# Altium footprint library SI944C.PcbLib: 78 footprints (part 2 of 5)
Each footprint in its own frame and in the unit in brackets; x right, y up, seen from the top. Pads: shape width x height; smd on the part's side, far side on the other; paste and mask are expansions set on the pad; w line width, h text height; cw(c..) or ccw(c..) is an arc to the next point about the centre after c.
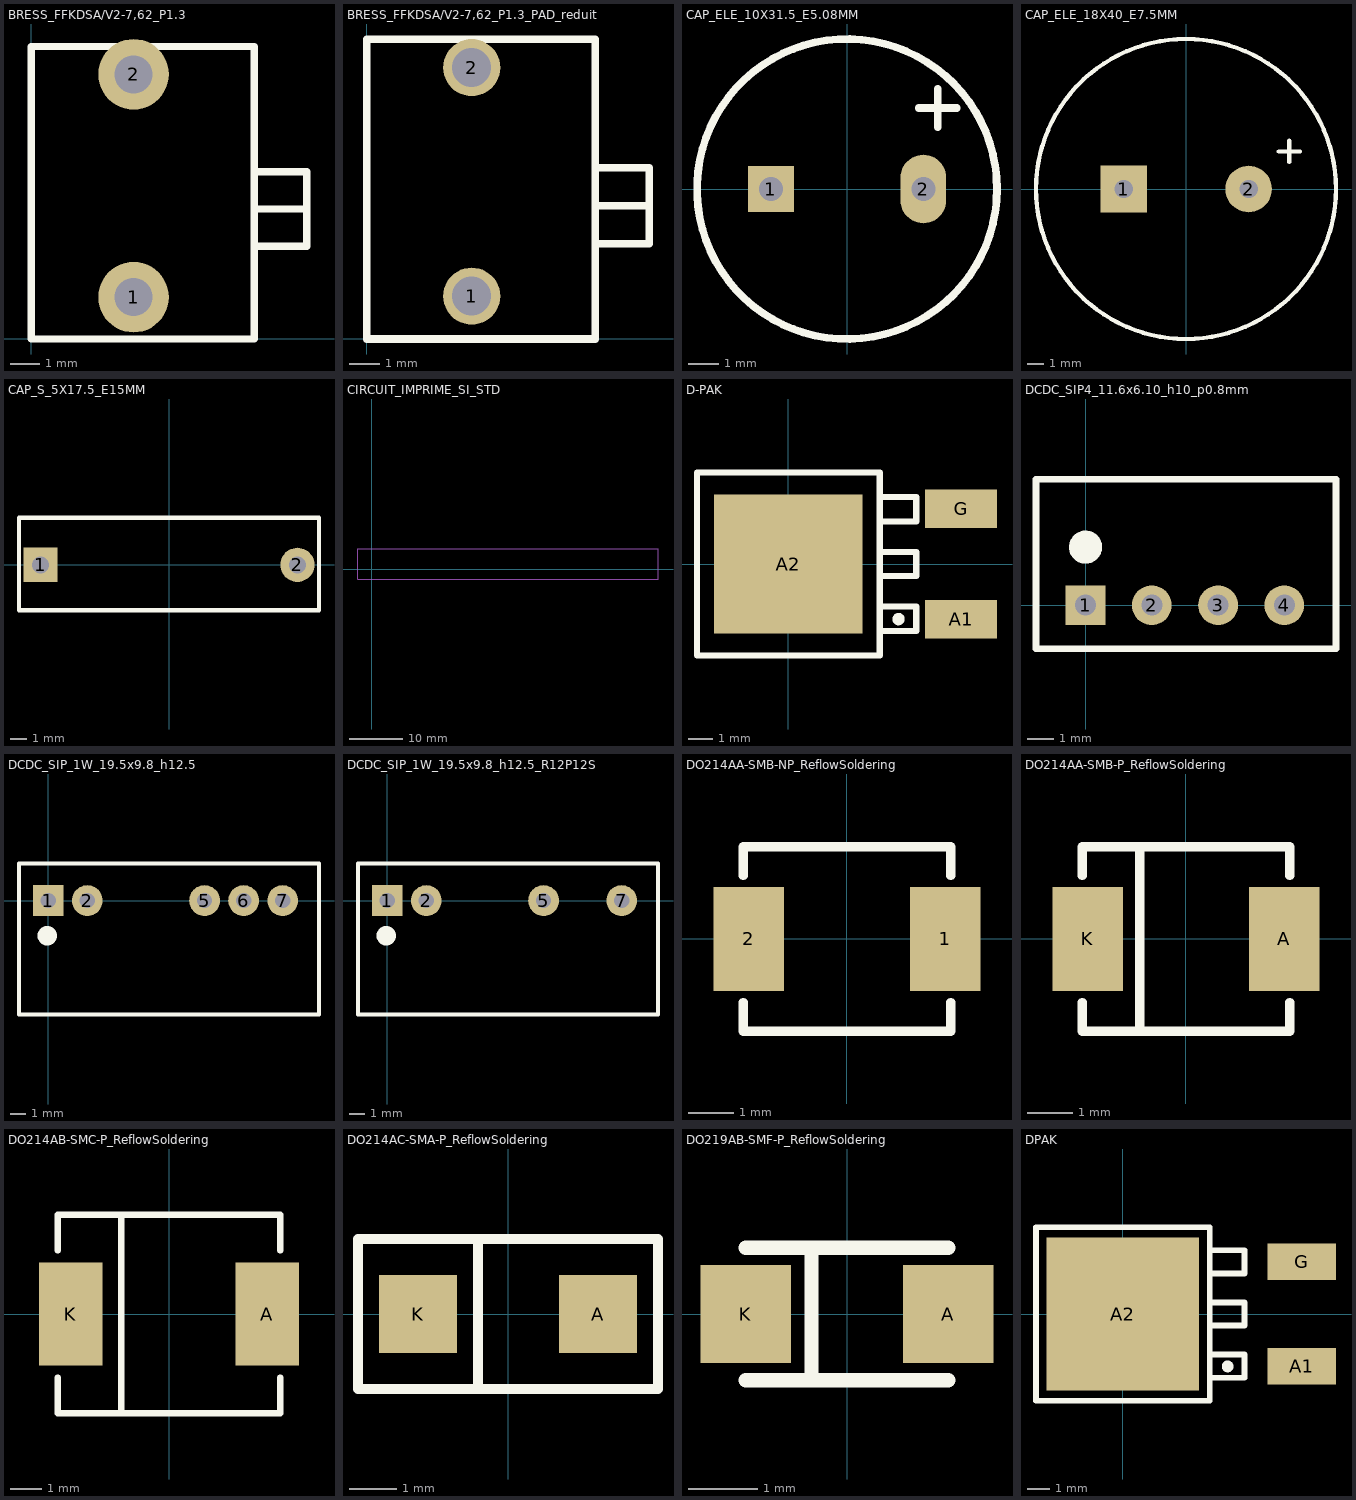
[diagram p1: the footprints below, top view; thin cyan lines are the x and y axes]

## BRESS_FFKDSA/V2-7,62_P1.3 [mm]
pads (2):
  round 2.413 hole 1.3: 1(3.5,1.43) 2(3.5,9.05)
Top Overlay:
  lines w0.254: 7.62,3.175 9.42,3.175 9.42,4.445 ; 7.62,5.715 9.42,5.715 9.42,4.445 ; 9.42,4.445 7.62,4.445 9.42,4.445 ; 0,0 7.62,0 7.62,10 0,10 0,0
3D body "1790377.stp": height 15.8, standoff -3.4, extent 0,0 9.42,10

## BRESS_FFKDSA/V2-7,62_P1.3_PAD_reduit [mm]
pads (2):
  round 1.905 hole 1.3: 1(3.5,1.43) 2(3.5,9.05)
Top Overlay:
  lines w0.254: 7.62,3.175 9.42,3.175 9.42,4.445 ; 7.62,5.715 9.42,5.715 9.42,4.445 ; 9.42,4.445 7.62,4.445 9.42,4.445 ; 0,0 0,10 7.62,10 7.62,0 0,0
3D body "1790377.stp": height 15.8, standoff -3.4, extent 0,0 9.42,10

## CAP_ELE_10X31.5_E5.08MM [mil]
height 1240.16
pads (2):
  rect 60x60 hole 31.5: 1(-100,0)
  oval 60x90 hole 31.5: 2(100,0)
Top Overlay:
  circle w10: c-0.2,0 r196.85
  lines w10: 93.75,106.25 143.75,106.25 ; 118.75,81.25 118.75,131.25
3D body "User Library-Capacitor Radial Electrolitic.STEP": height 1240.55, standoff 641.73, extent -195.55,-196.85 196.85,196.85
3D body "User Library-Capacitor Radial Electrolitic.STEP": height 1181.5, standoff -106.3, extent -195.55,-196.85 196.85,196.85

## CAP_ELE_18X40_E7.5MM [mil]
pads (2):
  rect 110x110 hole 43.31: 1(-147.64,0)
  round 110 hole 43.31: 2(147.64,0)
Top Overlay:
  circle w10: c-0.2,0 r354.33
  lines w10: 218.89,88.89 268.89,88.89 ; 243.89,63.89 243.89,113.89
3D body: height 59.06, standoff 0, extent -235.88,-235.75 234.7,235.76
3D body: height 0, standoff -590.55, extent -163.26,-15.72 -131.89,15.72
3D body: height 0, standoff -590.55, extent 132.02,-15.71 163.39,15.72
3D body "User Library-Capacitor Radial Electrolitic.STEP": height 1614.57, standoff -66.93, extent -353.21,-354.33 352.8,354.33

## CAP_S_5X17.5_E15MM [mil]
height 472.44
pads (2):
  rect 80x80 hole 39.37: 1(-300,0)
  round 80 hole 39.37: 2(300,0)
Top Overlay:
  lines w10: -350.39,-106.3 350.39,-106.3 350.39,110.24 -350.39,110.24 -350.39,-106.3
3D body: height 472.44, standoff 0, extent -350,-105 350,110

## CIRCUIT_IMPRIME_SI_STD [mil]
Top Layer:
  text ".refSI1" at -10,-10 h50
Mechanical 7:
  lines w8: -100,-75 -100,150 2100,150 2100,-75 -100,-75

## D-PAK [mm] "2.6 isolation"
pads (3):
  rect 3x1.6 smd paste-0.076: A1(7.2,-2.3) G(7.2,2.3)
  rect 6.198x5.8 smd paste-25.4: A2(0,0)
Top Overlay:
  circle w0.254: c4.595,-2.3 r0.129
  lines w0.254: 3.81,-2.794 5.334,-2.794 5.334,-1.778 3.81,-1.778 ; 3.81,-0.508 5.334,-0.508 5.334,0.508 3.81,0.508 ; 3.81,1.778 5.334,1.778 5.334,2.794 3.81,2.794 ; -3.81,-3.81 -3.81,3.81 3.81,3.81 3.81,-3.81 -3.81,-3.81
Top Paste:
  region: -2.794,-2.794 -0.254,-2.794 -0.254,-0.254 -2.794,-0.254
  region: 0.246,-2.794 2.786,-2.794 2.786,-0.254 0.246,-0.254
  region: -2.794,0.246 -0.254,0.246 -0.254,2.786 -2.794,2.786
  region: 0.246,0.246 2.786,0.246 2.786,2.786 0.246,2.786
3D body "SW3dPS-DPAK-1.STEP": height 2.34, standoff -0.07, extent -2.169,-3.3 7.769,3.24

## DCDC_SIP4_11.6x6.10_h10_p0.8mm [mil]
pads (4):
  rect 60x60 hole 31.5: 1(0,0)
  round 60 hole 31.5: 2(100,0) 3(200,0) 4(300,0)
Top Overlay:
  circle w25: c0,87.5 r12.5
  lines w10: -74.8,-65.94 -74.8,190.16 377.95,190.16 377.95,-65.94 -74.8,-65.94
3D body "User Library-4-Lead SIP_AM1S-1205SZ_Aimtec_DC-DC_Converter_1_Watt.STEP": height 399.61, standoff -120.08, extent -80,-50 380,186.22

## DCDC_SIP_1W_19.5x9.8_h12.5 [mm]
pads (5):
  rect 2x2 hole 1: 1(0,0)
  round 2 hole 1: 2(2.54,0) 5(10.16,0) 6(12.7,0) 7(15.24,0)
Top Overlay:
  circle w0.635: c-0.064,-2.286 r0.318
  lines w0.254: -1.9,-7.4 -1.9,2.4 17.6,2.4 17.6,-7.4 -1.9,-7.4
3D body: height 12.5, standoff 0, extent -1.9,-7.4 17.6,2.4
3D body: height 0, standoff -1.6, extent -0.25,-0.25 0.25,0.25
3D body: height 0, standoff -1.6, extent 2.29,-0.25 2.79,0.25
3D body: height 0, standoff -1.6, extent 9.91,-0.25 10.41,0.25
3D body: height 0, standoff -1.6, extent 12.45,-0.25 12.95,0.25
3D body: height 0, standoff -1.6, extent 14.99,-0.25 15.49,0.25

## DCDC_SIP_1W_19.5x9.8_h12.5_R12P12S [mm]
pads (4):
  rect 2x2 hole 1: 1(0,0)
  round 2 hole 1: 2(2.54,0) 5(10.16,0) 7(15.24,0)
Top Overlay:
  circle w0.635: c-0.064,-2.286 r0.318
  lines w0.254: -1.9,-7.4 -1.9,2.4 17.6,2.4 17.6,-7.4 -1.9,-7.4
3D body: height 12.5, standoff 0, extent -1.9,-7.4 17.6,2.4
3D body: height 0, standoff -1.6, extent -0.25,-0.25 0.25,0.25
3D body: height 0, standoff -1.6, extent 2.29,-0.25 2.79,0.25
3D body: height 0, standoff -1.6, extent 9.91,-0.25 10.41,0.25
3D body: height 0, standoff -1.6, extent 14.99,-0.25 15.49,0.25

## DO214AA-SMB-NP_ReflowSoldering [mil]
pads (2):
  rect 61x90 smd paste-3: 1(85,0) 2(-85,0)
Top Overlay:
  lines w8: -90,-55 -90,-80 90,-80 90,-55 ; 90,55 90,80 -90,80 ; -90,80 -90,55 -90,80
3D body "SW3DPS-DIOD SMD 10BF10-DEFAULT.STEP": height 94.49, standoff -1.18, extent -104.33,-70.87 104.33,70.87

## DO214AA-SMB-P_ReflowSoldering [mil]
pads (2):
  rect 61x90 smd paste-3: A(85,0) K(-85,0)
Top Overlay:
  lines w8: -90,-55 -90,-80 90,-80 90,-55 ; -40,-80 -40,80 ; 90,55 90,80 -90,80 ; -90,80 -90,55 -90,80
3D body "SW3dPS-DO-214AA SMB.STEP": height 90.75, standoff 0, extent -105.31,-70.87 107.28,70.87

## DO214AB-SMC-P_ReflowSoldering [mil]
pads (2):
  rect 80x130 smd paste-3: A(124,0) K(-124,0)
Top Overlay:
  lines w8: -140,-80 -140,-125 140,-125 140,-80 ; -140,80 -140,125 140,125 140,80 ; -60,-125 -60,125
3D body "SW3dPS-DO-214AB SMC.STEP": height 90.75, standoff 0, extent -157.48,-116.14 155.51,116.14

## DO214AC-SMA-P_ReflowSoldering [mil]
pads (2):
  rect 65x65 smd paste-3: A(75,0) K(-75,0)
Top Overlay:
  lines w8: -25,-62.5 -25,62.5 ; -125,-62.5 -125,62.5 125,62.5 125,-62.5 -125,-62.5
3D body "SW3dPS-DO-214AC SMA.STEP": height 90.75, standoff -3.94, extent -102.36,-51.18 102.36,51.18

## DO219AB-SMF-P_ReflowSoldering [mm]
pads (2):
  rect 1.3x1.4 smd paste-0.076: A(1.45,0) K(-1.45,0)
Top Overlay:
  lines w0.203: -1.45,-0.95 1.45,-0.95 ; -1.45,0.95 1.45,0.95 ; -0.508,-0.95 -0.508,0.95
3D body: height 0.98, standoff 0, extent -1.45,-0.95 1.45,0.95
3D body: height 0.99, standoff 0.95, extent -0.762,-0.889 -0.508,0.889

## DPAK [mm] "Triacs 4.0 Amp 600 Volt"
height 2.4
pads (3):
  rect 3x1.6 smd paste-0.076: A1(7.85,-2.286) G(7.85,2.286)
  rect 6.7x6.7 smd paste-25.4: A2(0,0)
Top Overlay:
  circle w0.254: c4.595,-2.3 r0.129
  lines w0.254: 3.81,-2.794 5.334,-2.794 5.334,-1.778 3.81,-1.778 ; 3.81,-0.508 5.334,-0.508 5.334,0.508 3.81,0.508 ; 3.81,1.778 5.334,1.778 5.334,2.794 3.81,2.794 ; -3.81,-3.81 -3.81,3.81 3.81,3.81 3.81,-3.81 -3.81,-3.81
Top Paste:
  region: -2.794,-2.794 -0.254,-2.794 -0.254,-0.254 -2.794,-0.254
  region: 0.246,-2.794 2.786,-2.794 2.786,-0.254 0.246,-0.254
  region: -2.794,0.246 -0.254,0.246 -0.254,2.786 -2.794,2.786
  region: 0.246,0.246 2.786,0.246 2.786,2.786 0.246,2.786
3D body "DPAK_TO-252AA.STEP": height 2.41, standoff 0.01, extent -1.75,-3.367 8.35,3.367